# Altium schematic symbol library LimeMicroAltiumLib_schLib_r01.SchLib: 328 symbols (part 9 of 9)
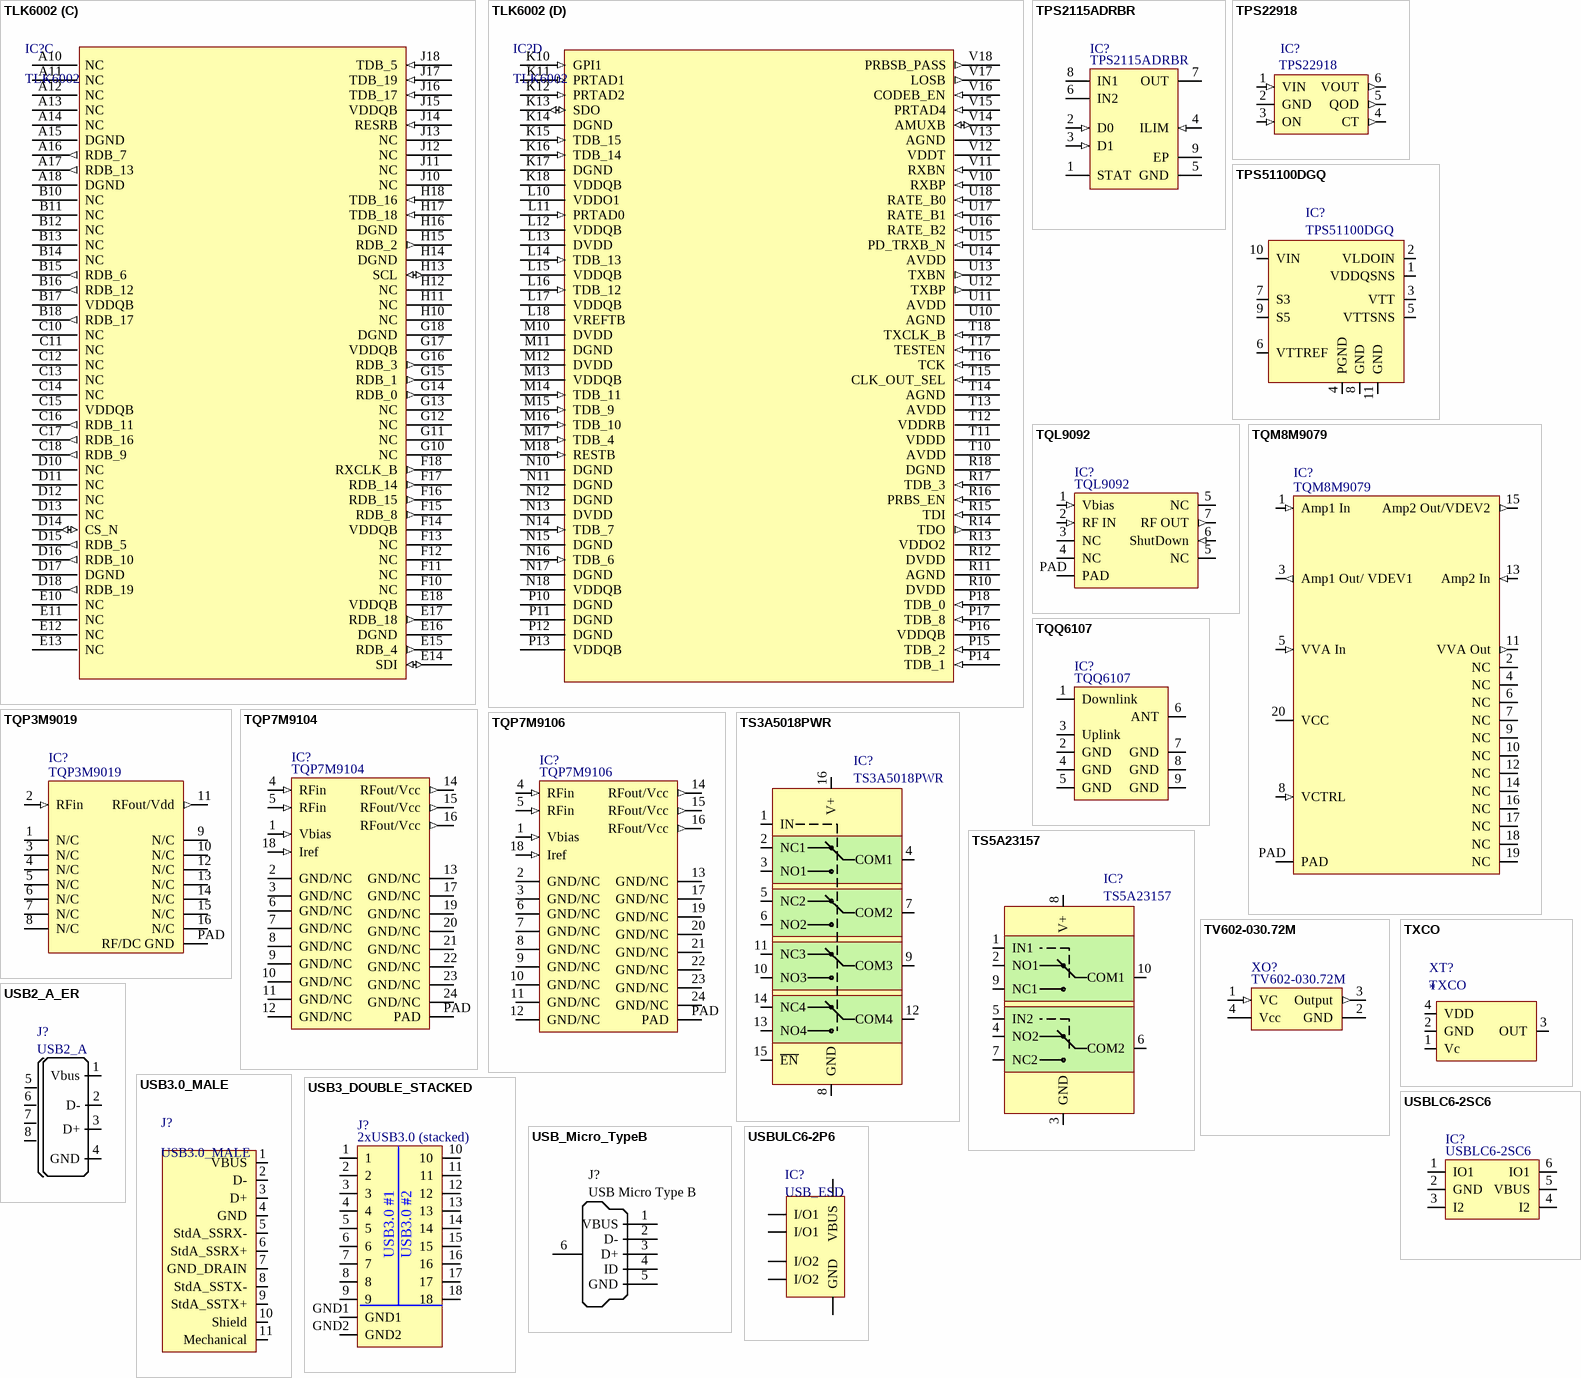
[diagram p55: symbols TLK6002 to USBULC6-2P6]

## TPS2115ADRBR
designator IC?
Dual In / Single Out Autoswitching Power Mux, 2.8 to 5.5 V, -40 to 85 degC, 8-pin SON (DRB), Green (RoHS & no Sb/Br); Part Description: n  OR Controller Source Selector Switch N-Channel 2:1 8-SON (3x3); Manufacturer: Texas Instruments; FET Type: N-Channel; Ratio - Input:Output: 2:1; Internal Switch(s): Yes; Current - Output (Max): 2A; Voltage - Supply: 2.8 V ~ 5.5 V; Supplier 1: Digi-Key; Manufacturer Part Number: TPS2115ADRBR; RoHS: RoHS Compliant; Category: Integrated Circuits (ICs); Stock 1: 12146; Pricing 1: 1=2.01, 10=1.801, 100=1.448, 500=1.18966, 1000=0.98571 (USD); Packaging: Digi-Reel®; Part Status: Active; Type: Source Selector Switch; Applications: Handheld/Mobile Devices; Operating Temperature: -40°C ~ 85°C; Mounting Type: Surface Mount; Package / Case: 8-VDFN Exposed Pad; Supplier Device Package: 8-SON (3x3); Base Part Number: TPS2115A; ComponentLink1URL: http://www.ti.com/lit/ds/symlink/tps2115a.pdf; ComponentLink1Description: http://www.ti.com/lit/ds/symlink/tps2115a.pdf; Supplier Part Number 1: 296-23394-6-ND
footprint TPS2115ADRBR_8SON (SON, 8-Leads, Body 3x3mm, Pitch 0.65mm, Thermal Pad 2.4x1.65mm, TI Recommended)
pins: 1 STAT (hiz) "STAT is an open-drain output that is Hi-Z if the IN2 switch is ON. STAT pulls low if the IN1 switch is ON or if OUT is Hi-Z (i.e., E\N\ is equal to logic 0).", 2 D0 (in) "TTL- and CMOS-compatible input pins. Each pin has a 1-uA pull-up.", 3 D1 (in) "TTL- and CMOS-compatible input pins. Each pin has a 1-uA pull-up.", 4 ILIM (in) "A resistor RILIM from ILIM to GND sets the current limit IL to 500/RILIM", 5 GND (power) "Ground", 6 IN2 (power) "Secondary power switch input. The IN2 switch can be enabled only if the IN2 supply is above the UVLO threshold and at least one supply exceeds the internal VDD UVLO.", 7 OUT (power) "Power switch output", 8 IN1 (power) "Primary power switch input. The IN1 switch can be enabled only if the IN1 supply is above the UVLO threshold and at least one supply exceeds the internal VDD UVLO.", 9 EP (power) "Tie to GND. Connect to internal planes for improved heatsinking with multiple vias."

## TPS22918
designator IC?
Part Description: IC PWR DIST SWITCH SNGL SOT23-6; Manufacturer: Texas Instruments; Manufacturer Part Number: TPS22918DBVT; Switch Type: General Purpose; Number of Outputs: 1; Ratio - Input:Output: 1:1; Output Configuration: High Side; Output Type: N-Channel; Interface: On/Off; Voltage - Load: 1 V ~ 5.5 V; Voltage - Supply (Vcc/Vdd): Not Required; Current - Output (Max): 2A; Rds On (Typ): 53 mOhm; Input Type: Non-Inverting; Supplier 1: Digi-Key; RoHS: RoHS Compliant; Category: Integrated Circuits (ICs); Stock 1: 16592; Pricing 1: 1=0.63, 10=0.551, 100=0.4222 (USD); Packaging: Digi-Reel®; Part Status: Active; Features: Load Discharge, Slew Rate Controlled; Fault Protection: -; Operating Temperature: -40°C ~ 105°C (TA); Package / Case: SOT-23-6; Supplier Device Package: SOT-23-6; ComponentLink1URL: http://www.ti.com/lit/ds/symlink/tps22918.pdf; ComponentLink1Description: http://www.ti.com/lit/ds/symlink/tps22918.pdf; Supplier Part Number 1: 296-44073-6-ND
footprint SOT23-6
pins: 1 VIN (in), 2 GND, 3 ON (in), 4 CT (out), 5 QOD (out), 6 VOUT (out)

## TPS51100DGQ
designator IC?
Voltage - Output: 1.2 V ~ 3.6 V; Voltage - Input: 4.75 V ~ 5.25 V; Supplier 1: Digi-Key; Package / Case: 10-TFSOP, 10-MSOP (0.118", 3.00mm Width) Exposed Pad; Operating Temperature: -40°C ~ 85°C; Category: Integrated Circuits (ICs); Supplier Part Number 1: 296-23595-6-ND
footprint TPS51100DGQ (TSSOP, 10-Leads, Body 3,00x3,00mm, Pitch 0,50mm, IPC Medium Density)
pins: 1 VDDQSNS, 2 VLDOIN, 3 VTT, 4 PGND, 5 VTTSNS, 6 VTTREF, 7 S3 (in), 8 GND, 9 S5 (in), 10 VIN, 11 GND

## TQL9092
designator IC?
Part Description: RF Amplifier .6-4.2GHz NF .6dB Flat Gain 2dB
footprint TQL9092
pins: 1 Vbias (in), 2 RF IN (in), 3 NC, 4 NC, 5 NC, 5 NC, 6 ShutDown (in), 7 RF OUT (out), PAD

## TQM8M9079
designator IC?
Part Description: RF Amplifier 500-2700MHz NF 4dB Gain 38dB Attn. 30dB; Manufacturer: Qorvo; Manufacturer Part Number 1: TQM8M9079; Supplier Part Number 1: 772-TQM8M9079; Supplier 1: Mouser
footprint TQM8M9079
pins: 1 Amp1 In (in), 2 NC, 3 Amp1 Out/ VDEV1 (out), 4 NC, 5 VVA In (in), 6 NC, 7 NC, 8 VCTRL (in), 9 NC, 10 NC, 11 VVA Out (out), 12 NC, 13 Amp2 In (in), 14 NC, 15 Amp2 Out/VDEV2 (out), 16 NC, 17 NC, 18 NC, 19 NC, 20 VCC (power), PAD

## TQP3M9019
designator IC?
High Linearity LNA Gain Block (20 – 4000 MHz)
footprint TQP3M9019_QFN3X3-16 (Quad Flat No Lead, Plastic; 16 Terminals; Body 3 x 3 mm; Pitch 0.5 mm)
pins: 1 N/C, 2 RFin (in), 3 N/C, 4 N/C, 5 N/C, 6 N/C, 7 N/C, 8 N/C, 9 N/C, 10 N/C, 11 RFout/Vdd (out), 12 N/C, 13 N/C, 14 N/C, 15 N/C, 16 N/C, PAD RF/DC GND

## TQP7M9104
designator IC?
2 Watt High Linearity Amplifier (700 - 2700 MHz); Part Description: RF Amplifier 700-4000MHZ 5VOLT GAIN 15.8DB NF 4.4DB; Manufacturer: Qorvo; Manufacturer Part Number 1: TQP7M9104; Supplier Part Number 1: 772-TQP7M9104; Supplier 1: Mouser
footprint TQP7M9104_QFN24
pins: 1 Vbias (in), 2 GND/NC, 3 GND/NC, 4 RFin (in), 5 RFin (in), 6 GND/NC, 7 GND/NC, 8 GND/NC, 9 GND/NC, 10 GND/NC, 11 GND/NC, 12 GND/NC, 13 GND/NC, 14 RFout/Vcc (out), 15 RFout/Vcc (out), 16 RFout/Vcc (out), 17 GND/NC, 18 Iref (in), 19 GND/NC, 20 GND/NC, 21 GND/NC, 22 GND/NC, 23 GND/NC, 24 GND/NC, PAD

## TQP7M9106
designator IC?
2 Watt High Linearity Amplifier (50 - 1500 MHz); Part Description: RF Amplifier 50-1500MHz 2W Gain 20.8dB@940MHz; Manufacturer: Qorvo; Manufacturer Part Number 1: TQP7M9106; Supplier Part Number 1: 772-TQP7M9106; Supplier 1: Mouser
footprint TQP7M9106_QFN24 (Footprint not found)
pins: 1 Vbias (in), 2 GND/NC, 3 GND/NC, 4 RFin (in), 5 RFin (in), 6 GND/NC, 7 GND/NC, 8 GND/NC, 9 GND/NC, 10 GND/NC, 11 GND/NC, 12 GND/NC, 13 GND/NC, 14 RFout/Vcc (out), 15 RFout/Vcc (out), 16 RFout/Vcc (out), 17 GND/NC, 18 Iref (in), 19 GND/NC, 20 GND/NC, 21 GND/NC, 22 GND/NC, 23 GND/NC, 24 GND/NC, PAD

## TQQ6107
designator IC?
Part Description: Band 7 BAW Duplexer, 70 MHz Bandwidth, 2.00 x 2.50 x 1.0 mm; Manufacturer Part Number 1: TQQ6107; Supplier Part Number 1: TQQ6107; Supplier 1: Qorvo
footprint TQQ6107
pins: 1 Downlink, 2 GND, 3 Uplink, 4 GND, 5 GND, 6 ANT (io), 7 GND, 8 GND, 9 GND

## TS3A5018PWR
designator IC?
Manufacturer: TEXAS INSTRUMENTS; On State Resistance Max: 10; Analog Switch Case: TSSOP; Supply Voltage Range: 2.3V to 3.6; No. of Pins: 16; Analog Switch Type: SPDT; Supplier 1: Newark; Manufacturer Part Number: TS3A5018PW; Supplier Part Number 1: 71J8329
footprint TS3A5018PWR (TSOP, 16-Leads, Body 5,00x4,40mm, Pitch 0,65mm, IPC Medium Density)
pins: 1 IN, 2 NC1, 3 NO1, 4 COM1, 5 NC2, 6 NO2, 7 COM2, 8 GND, 9 COM3, 10 NO3, 11 NC3, 12 COM4, 13 NO4, 14 NC4, 15 ~{EN}, 16 V+

## TS5A23157
designator IC?
TS3A5018; Manufacturer: Texas Instruments; Current - Supply: 1µA; Circuit: 2 x SPDT; On-State Resistance: 10 Ohm; Voltage Supply Source: Single Supply; Voltage - Supply, Single/Dual (±): 1.8 V ~ 5.5 V; Function: Switch; Supplier 1: Digi-Key; Category: Integrated Circuits (ICs); Supplier Device Package: 10-VSSOP; Package / Case: 10-TFSOP, 10-MSOP (0.118", 3.00mm Width); Mounting Type: Surface Mount; Supplier Part Number 1: 296-17076-1-ND
footprint TS5A23157 (TSSOP, 10-Leads, Body 3,00x3,00mm, Pitch 0,50mm, IPC Medium Density)
pins: 1 IN1, 2 NO1, 3 GND, 4 NO2, 5 IN2, 6 COM2, 7 NC2, 8 V+, 9 NC1, 10 COM1

## TV602-030.72M
designator XO?
Part Description: TV602-030.72M voltage controlled oscillator, 5x7mm, high stability and low phase noise; Manufacturer: Connor Winfield; Supplier Part Number 1: TV602-030.72M; Manufacturer Part Number 1: TV602-030.72M; Supplier 1: Connor Winfield
footprint TV602-030.72M (TV602-030.72M Connor Winfield)
pins: 1 VC (in), 2 GND, 3 Output (out), 4 Vcc (power)

## TXCO
designator XT?
Assembly Info: *
pins: 1 Vc, 2 GND, 3 OUT, 4 VDD

## USB2_A_ER
designator J?, comment USB2_A
Manufacturer Part Number: A-USB/2-A-E-R; Connector Type: USB - A; Specifications: USB 2.0; Number of Contacts: 4; Supplier 1: Digi-Key; Category: Connectors, Interconnects; Supplier Part Number 1: AE10400-ND
footprint USB2_A
pins: 1 Vbus, 2 D-, 3 D+, 4 GND, 5 Shell, 6 Shell, 7 Shell, 8 Shell

## USB3.0_MALE
designator J?
Manufacturer Part Number 1: 692112030100; Manufacturer: Wurth Electronics Inc; Part Description: USB - A USB 3.0, Super Speed Plug Connector 9 Position Surface Mount, Right Angle, Horizontal; Specifications: USB 3.0, Super Speed; Number of Contacts: 9; Connector Type: USB - A; Gender: Plug; Packaging: Tray; Features: Board Lock, Shielded; Ingress Protection: -; Category: Connectors, Interconnects; RoHS: RoHS Compliant; Mounting Type: Surface Mount, Right Angle, Horizontal; Supplier 1: Digi-Key; Supplier Part Number 1: 732-3157-ND
footprint USB3A_SM
pins: 1 VBUS, 2   D-, 3 D+, 4 GND, 5 StdA_SSRX-, 6 StdA_SSRX+, 7 GND_DRAIN, 8 StdA_SSTX-, 9 StdA_SSTX+, 10 Shield, 11 Mechanical

## USB3_DOUBLE_STACKED
designator J?, comment 2xUSB3.0 (stacked)
Part Description: 2xUSB3.0, vertical, stacked
footprint USB3_DOUBLE_STACKED
pins: 1, 2, 3, 4, 5, 6, 7, 8, 9, 10, 11, 12, 13, 14, 15, 16, 17, 18, GND1, GND2
text: USB3.0 #1; USB3.0 #2

## USB_Micro_TypeB
designator J?, comment USB Micro Type B
Connector SMD USB Micro Type B; Connector Type: USB - micro B; Number of Contacts: 5; Supplier 1: Digi-Key; Category: Connectors, Interconnects; Mounting Type: Surface Mount, Right Angle, Horizontal; Supplier Part Number 1: 609-4616-2-ND
footprint microUSB
pins: 1 VBUS, 2 D-, 3 D+, 4 ID, 5 GND, 6 Shell

## USBLC6-2SC6
designator IC?
Manufacturer: STMicroelectronics; Part Description: TVS DIODE 5.25V 17V SOT23-6; Voltage - Reverse Standoff (Typ): 5.25V; Voltage - Breakdown (Min): 6V; Voltage - Clamping (Max) @ Ipp: 17V; Current - Peak Pulse (10/1000µs): 5A (8/20µs); Power Line Protection: Yes; Supplier 1: Digi-Key; Manufacturer Part Number 1: USBLC6-2SC6; RoHS: RoHS Compliant; Category: Circuit Protection; Stock 1: 59416; Pricing 1: 1=0.49, 10=0.419, 100=0.3131, 500=0.24602, 1000=0.1901 (USD); Packaging: Cut Tape (CT); Part Status: Active; Type: Steering (Rail to Rail); Power - Peak Pulse: -; Applications: Ethernet; Capacitance @ Frequency: -; Operating Temperature: -40°C ~ 125°C (TJ); Mounting Type: Surface Mount; Package / Case: SOT-23-6; Supplier Device Package: SOT-23-6; Base Part Number: USBLC6-2; ComponentLink1URL: http://www.st.com/content/ccc/resource/technical/document/datasheet/06/1d/48/9c/6c/20/4a/b2/CD00050750.pdf/files/CD00050750.pdf/jcr:content/translations/en.CD00050750.pdf; ComponentLink1Description: http://www.st.com/content/ccc/resource/technical/document/datasheet/06/1d/48/9c/6c/20/4a/b2/CD00050750.pdf/files/CD00050750.pdf/jcr:content/translations/en.CD00050750.pdf; Supplier Part Number 1: 497-5235-1-ND
footprint SOT23-6
pins: 1 IO1 (io), 2 GND, 3 I2 (io), 4 I2 (io), 5 VBUS, 6 IO1 (io)

## USBULC6-2P6
designator IC?, comment USB_ESD
Manufacturer Part Number 1: USBULC6-2P6; Manufacturer: STMicroelectronics; Current - Peak Pulse (10/1000µs): 5A (8/20µs); Capacitance @ Frequency: 1pF @ 1MHz; Bidirectional Channels: 2; Voltage - Reverse Standoff (Typ): 5V; Voltage - Breakdown (Min): 6V; Power Line Protection: Yes; Voltage - Clamping (Max) @ Ipp: 17V; Supplier 1: Digi-Key; Unidirectional Channels: -; Mounting Type: Surface Mount; Applications: Ethernet; Type: Steering (Rail to Rail); Power - Peak Pulse: -; Category: Circuit Protection; Supplier Device Package: SOT-666; Package / Case: SOT-563, SOT-666; Packaging: Cut Tape (CT); Operating Temperature: -; RoHS: RoHS Compliant; Supplier Part Number 1: 497-15162-1-ND
footprint USBULC6
pins: 1 I/O1, 2 GND, 3 I/O2, 4 I/O2, 5 VBUS, 6 I/O1

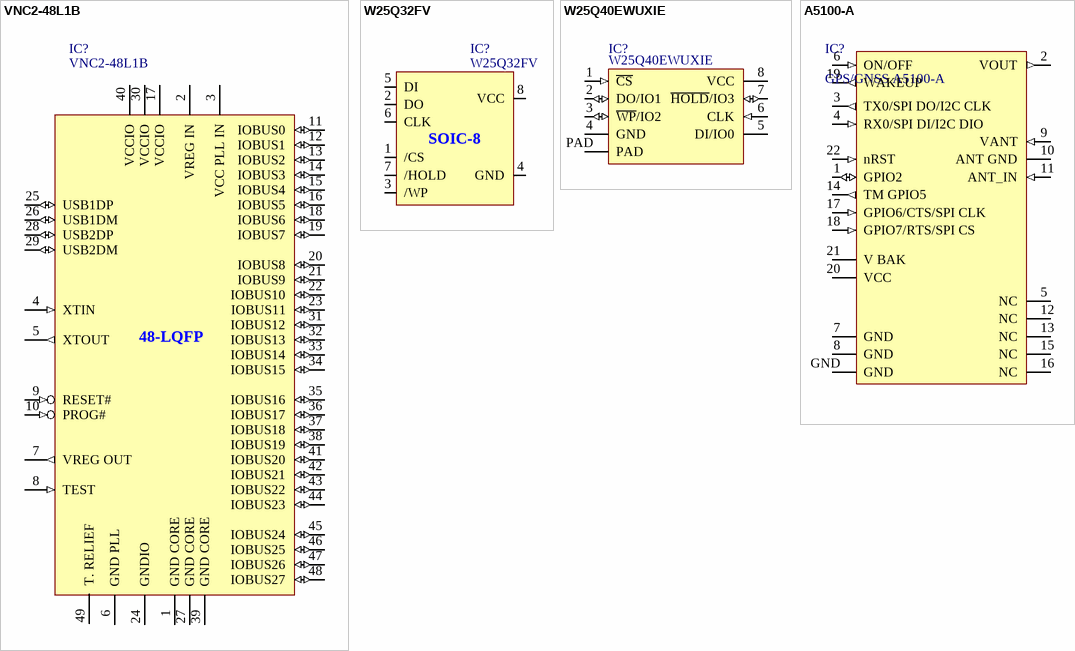
[diagram p48: symbols VNC2-48L1B to А5100-А]

## VNC2-48L1B
designator IC?
Manufacturer Part Number: VNC2-48L1B-REEL; Manufacturer: FTDI, Future Technology Devices International Ltd; Current - Supply: 25mA; Voltage - Supply: 1.62 V ~ 1.98 V; Interface: SPI, UART; Standards: USB 2.0; Function: Controller; Supplier 1: Digi-Key; Supplier Device Package: 48-LQFP (7x7); Category: Integrated Circuits (ICs); Supplier: Digi-Key; Supplier Part Number 1: 768-1049-2-ND
footprint VNC2-48L1B_LQFP48 (VNC2-48L1B chip with LQFP-48 package)
pins: 1 GND CORE (power), 2 VREG IN (power), 3 VCC PLL IN (power), 4 XTIN (in), 5 XTOUT (out), 6 GND PLL (power), 7 VREG OUT (out), 8 TEST (in), 9 RESET# (in), 10 PROG# (in), 11 IOBUS0 (io), 12 IOBUS1 (io), 13 IOBUS2 (io), 14 IOBUS3 (io), 15 IOBUS4 (io), 16 IOBUS5 (io), 17 VCCIO (power), 18 IOBUS6 (io), 19 IOBUS7 (io), 20 IOBUS8 (io), 21 IOBUS9 (io), 22 IOBUS10 (io), 23 IOBUS11 (io), 24 GNDIO (power), 25 USB1DP (io), 26 USB1DM (io), 27 GND CORE (power), 28 USB2DP (io), 29 USB2DM (io), 30 VCCIO (power), 31 IOBUS12 (io), 32 IOBUS13 (io), 33 IOBUS14 (io), 34 IOBUS15 (io), 35 IOBUS16 (io), 36 IOBUS17 (io), 37 IOBUS18 (io), 38 IOBUS19 (io), 39 GND CORE (power), 40 VCCIO (power), 41 IOBUS20 (io), 42 IOBUS21 (io), 43 IOBUS22 (io), 44 IOBUS23 (io), 45 IOBUS24 (io), 46 IOBUS25 (io), 47 IOBUS26 (io), 48 IOBUS27 (io), 49 T. RELIEF (power)
text: 48-LQFP

## W25Q32FV
designator IC?
Manufacturer: Winbond Electronics; Manufacturer Part Number 1: W25Q32FVSSIG; Voltage - Supply: 2.7 V ~ 3.6 V; Interface: SPI Serial; Memory Type: FLASH; Speed: 104MHz; Memory Size: 32M (4M x 8); Supplier 1: Digi-Key; Package / Case: 8-SOIC (0.209", 5.30mm Width); RoHS: RoHS Compliant; Packaging: Tube; Format - Memory: FLASH; Supplier Device Package: 8-SOIC; Operating Temperature: -40°C ~ 85°C; Category: Integrated Circuits (ICs); Supplier Part Number 1: W25Q32FVSSIG-ND
footprint M25P40-VMN6TPB_SO8N (SOIC, 8-Leads, Body 4,90x3,90mm, Pitch 1,27mm, IPC Medium Density)
pins: 1 /CS, 2 DO, 3 /WP, 4 GND, 5 DI, 6 CLK, 7 /HOLD, 8 VCC
text: SOIC-8

## W25Q40EWUXIE
designator IC?
Manufacturer: Winbond Electronics; Manufacturer Part Number 1: W25Q40EWUXIE TR; Part Description: FLASH - NOR Memory IC 4Mb (512K x 8) SPI 8-USON (2x3); Memory Type: Non-Volatile; Memory Format: FLASH; Memory Size: 4Mb (512K x 8); Write Cycle Time - Word, Page: 800µs; Memory Interface: SPI; Voltage - Supply: 1.65 V ~ 1.95 V; Supplier 1: Digi-Key; RoHS: RoHS Compliant; Category: Integrated Circuits (ICs); Stock 1: 4000; Pricing 1: 1=0.75 (USD); Packaging: Cut Tape (CT); Part Status: Active; Technology: FLASH - NOR; Access Time: -; Operating Temperature: -40°C ~ 85°C (TA); Mounting Type: Surface Mount; Package / Case: 8-UFDFN Exposed Pad; Supplier Device Package: 8-USON (2x3); ComponentLink1URL: https://www.winbond.com/resource-files/w25q40ew%20revf%2011252015%20sfdp.pdf; ComponentLink1Description: https://www.winbond.com/resource-files/w25q40ew%20revf%2011252015%20sfdp.pdf; Supplier Part Number 1: W25Q40EWUXIE CT-ND
footprint W25Q40EWUXIE_8-USON
pins: 1 ~{CS} (in), 2 DO/IO1 (io), 3 ~{WP}/IO2 (io), 4 GND, 5 DI/IO0, 6 CLK (in), 7 ~{HOLD}/IO3 (io), 8 VCC (power), PAD

## А5100-А
designator IC?, comment GPS/GNSS A5100-A
Manufacturer: Maestro Wireless Solutions; Part Description: RF Receiver 1.575GHz -165dBm 115.2kBaud Module; Frequency: 1.575GHz; Sensitivity: -165dBm; Data Rate (Max): 115.2kBaud; Current - Receiving: 40mA; Voltage - Supply: 3.3V; Supplier 1: Digi-Key; Manufacturer Part Number 1: A5100-A; RoHS: RoHS Compliant; Category: RF/IF and RFID; Stock 1: 1368; Pricing 1: 1=20.9, 10=19.328, 25=17.7608, 100=16.5071, 250=15.14888 (USD); Packaging: Cut Tape (CT); Part Status: Active; Modulation or Protocol: -; Applications: General Purpose; Data Interface: -; Memory Size: -; Antenna Connector: -; Features: -; Operating Temperature: -40°C ~ 85°C; Package / Case: Module; Supplier Device Package: Module; ComponentLink1URL: http://update.maestro-wireless.com/GNSS/A5100-A/Maestro_A5100-A_GPS_Module_Product%20Brief_v1.2.pdf; ComponentLink1Description: http://update.maestro-wireless.com/GNSS/A5100-A/Maestro_A5100-A_GPS_Module_Product%20Brief_v1.2.pdf; Supplier Part Number 1: 1530-1012-1-ND
footprint A5100-A_GPS_GNSS (RF Receiver 1.575GHz -165dBm 115.2kBaud Module)
pins: 1 GPIO2 (io), 2 VOUT (out), 3 TX0/SPI DO/I2C CLK (out), 4 RX0/SPI DI/I2C DIO (in), 5 NC, 6 ON/OFF (in), 7 GND, 8 GND, 9 VANT (in), 10 ANT GND, 11 ANT_IN (in), 12 NC, 13 NC, 14 TM GPIO5 (out), 15 NC, 16 NC, 17 GPIO6/CTS/SPI CLK (in), 18 GPIO7/RTS/SPI CS (in), 19 WAKEUP (out), 20 VCC (power), 21 V BAK (power), 22 nRST (in), GND